# Altium footprint library 集大电协1.5.PcbLib: 227 footprints (part 4 of 18)
Each footprint in its own frame and in the unit in brackets; x right, y up, seen from the top. Pads: shape width x height; smd on the part's side, far side on the other; paste and mask are expansions set on the pad; w line width, h text height; cw(c..) or ccw(c..) is an arc to the next point about the centre after c.
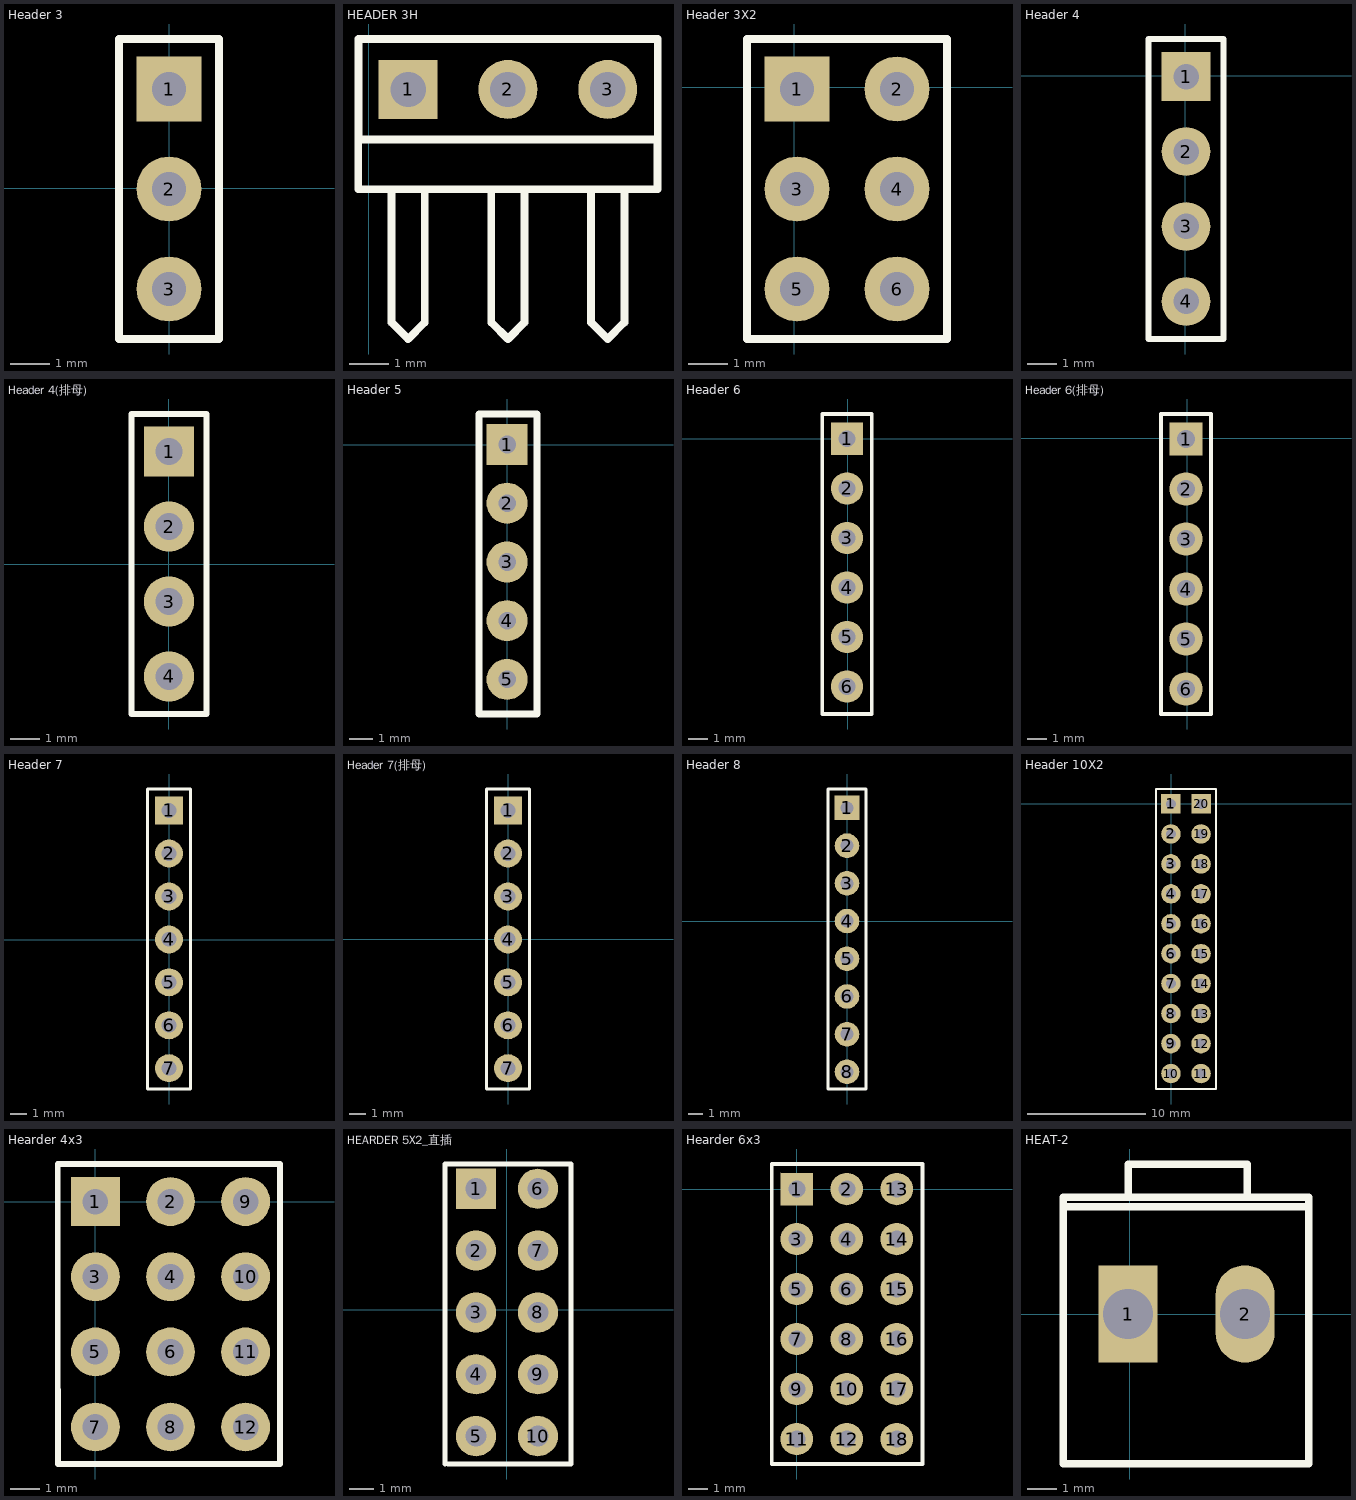
[diagram p3: the footprints below, top view; thin cyan lines are the x and y axes]

## Header 3 [mil]
pads (3):
  rect 65x65 hole 34: 1(0,99)
  round 65 hole 34: 2(0,-1) 3(0,-101)
Top Overlay:
  lines w7.87: -50,-151 50,-151 50,149 -50,149 -50,-151
3D body "HDR1X3_2.54mm.STEP": height 336.22, standoff -118.11, extent -50,-151 50,149

## HEADER 3H [mm]
pads (3):
  rect 1.5x1.5 hole 0.9: 1(1.007,-2.396)
  round 1.5 hole 0.9: 2(3.547,-2.396) 3(6.087,-2.396)
Top Overlay:
  lines w0.2: -0.258,-3.652 -0.258,-1.112 7.362,-1.112 7.362,-3.652 ; 0.584,-4.936 0.584,-8.323 1.007,-8.746 1.431,-8.323 1.431,-4.936 ; 3.124,-4.936 3.124,-8.323 3.547,-8.746 3.971,-8.323 3.971,-4.936 ; 5.664,-4.936 5.664,-8.323 6.087,-8.746 6.511,-8.323 6.511,-4.936 ; -0.263,-4.936 7.357,-4.936 7.357,-3.666 -0.263,-3.666 -0.263,-4.936
3D body "hdr3.stp": height 2.54, standoff -1, extent -0.263,-12.365 7.357,-2.015

## Header 3X2 [mil]
pads (6):
  rect 65x65 hole 34: 1(2.94,-1.52)
  round 65 hole 34: 2(102.94,-1.52) 3(2.94,-101.52) 4(102.94,-101.52) 5(2.94,-201.52) 6(102.94,-201.52)
Top Overlay:
  lines w7.87: -47.06,-59.86 -47.06,-251.52 ; -47.06,-251.52 152.94,-251.52 152.94,48.48 -47.06,48.48 -47.06,-251.52
3D body "61300621121.stp": height 338.19, standoff -116.14, extent -45.52,-254 154.48,46

## Header 4 [mil]
pads (4):
  rect 65x65 hole 34: 1(0.95,-0.93)
  round 65 hole 34: 2(0.95,-100.93) 3(0.95,-200.93) 4(0.95,-300.93)
Top Overlay:
  lines w7.87: -49.05,-350.93 50.95,-350.93 50.95,49.07 -49.05,49.07 -49.05,-350.93
3D body "HDR1X4_2.54mm.STEP": height 336.22, standoff -118.11, extent -51.18,-353.54 48.82,46.46

## Header 4(排母) [mm]
pads (4):
  rect 1.7x1.7 hole 0.9: 1(0.015,3.826)
  round 1.7 hole 0.9: 2(0.015,1.286) 3(0.015,-1.254) 4(0.015,-3.794)
Top Overlay:
  lines w0.2: -1.255,-5.064 -1.255,5.096 1.285,5.096 1.285,-5.064 -1.255,-5.064
3D body "HDR2.54-1P_M.STEP": height 8.5, standoff -3, extent -1.255,0.016 1.285,2.556
3D body "HDR2.54-1P_M.STEP": height 8.5, standoff -3, extent -1.255,2.556 1.285,5.096
3D body "HDR2.54-1P_M.STEP": height 8.5, standoff -3, extent -1.255,-5.064 1.285,-2.524
3D body "HDR2.54-1P_M.STEP": height 8.5, standoff -3, extent -1.255,-2.524 1.285,0.016

## Header 5 [mil]
pads (5):
  rect 70x70 hole 30: 1(0,0)
  round 70 hole 30: 2(0,-100) 3(0,-200) 4(0,-300) 5(0,-400)
Top Overlay:
  lines w12: -48,-459 -48,52 51,52 51,-459 -48,-459
3D body "User Library-CONMHS2A-2mm54.STEP": height 314.96, standoff -118.11, extent -46.81,-452 53.19,-252
3D body "HDR1X3_2.54mm.STEP": height 336.22, standoff -118.11, extent -50,-250 50,50

## Header 6 [mil]
pads (6):
  rect 65x65 hole 34: 1(-1.02,0.06)
  round 65 hole 34: 2(-1.02,-99.94) 3(-1.02,-199.94) 4(-1.02,-299.94) 5(-1.02,-399.75) 6(-1.02,-499.75)
Top Overlay:
  lines w7.87: -51.02,-555.12 48.98,-555.12 48.98,50.06 -51.02,50.06 -51.02,-555.12
3D body "HDR1X6_2.54mm.STEP": height 336.22, standoff -118.11, extent -50,-553.74 50,46.26

## Header 6(排母) [mm]
pads (6):
  rect 1.7x1.7 hole 0.9: 1(-0.06,-0.04)
  round 1.7 hole 0.9: 2(-0.06,-2.58) 3(-0.06,-5.12) 4(-0.06,-7.66) 5(-0.06,-10.2) 6(-0.06,-12.74)
Top Overlay:
  lines w0.2: -1.33,-14.01 -1.33,1.23 1.21,1.23 1.21,-14.01 -1.33,-14.01
3D body "HDR2.54-1P_M.STEP": height 8.5, standoff -3, extent -1.33,-11.47 1.21,-8.93
3D body "HDR2.54-1P_M.STEP": height 8.5, standoff -3, extent -1.33,-8.93 1.21,-6.39
3D body "HDR2.54-1P_M.STEP": height 8.5, standoff -3, extent -1.33,-14.01 1.21,-11.47
3D body "HDR2.54-1P_M.STEP": height 8.5, standoff -3, extent -1.33,-3.85 1.21,-1.31
3D body "HDR2.54-1P_M.STEP": height 8.5, standoff -3, extent -1.33,-1.31 1.21,1.23
3D body "HDR2.54-1P_M.STEP": height 8.5, standoff -3, extent -1.33,-6.39 1.21,-3.85

## Header 7 [mil]
pads (7):
  rect 65x65 hole 34: 1(0,301)
  round 65 hole 34: 2(0,201) 3(0,101) 4(0,1) 5(0,-98.8) 6(0,-198.8)
  round 65 hole 34 paste+0: 7(0,-298.61)
Top Overlay:
  lines w7.87: -50,-347 -50,351 50,351 50,-347 -49,-347
3D body: height 336.22, standoff -118.11, extent -50,-348.61 50,351.39

## Header 7(排母) [mil]
pads (7):
  rect 65x65 hole 34: 1(0,300)
  round 65 hole 34: 2(0,200) 3(0,100) 4(0,0) 5(0,-99.8) 6(0,-199.8)
  round 65 hole 34 paste+0: 7(0,-299.61)
Top Overlay:
  lines w7.87: -50,-348 -50,350 50,350 50,-348 -49,-348
3D body "HDR2.54-1P_M.STEP": height 334.65, standoff -118.11, extent -50,250 50,350
3D body "HDR2.54-1P_M.STEP": height 334.65, standoff -118.11, extent -50,150 50,250
3D body "HDR2.54-1P_M.STEP": height 334.65, standoff -118.11, extent -50,50 50,150
3D body "HDR2.54-1P_M.STEP": height 334.65, standoff -118.11, extent -50,-50 50,50
3D body "HDR2.54-1P_M.STEP": height 334.65, standoff -118.11, extent -50,-149.8 50,-49.8
3D body "HDR2.54-1P_M.STEP": height 334.65, standoff -118.11, extent -50,-249.8 50,-149.8
3D body "HDR2.54-1P_M.STEP": height 334.65, standoff -118.11, extent -50,-349.61 50,-249.61

## Header 8 [mil]
pads (8):
  rect 65x65 hole 34: 1(0,300)
  round 65 hole 34: 2(0,200) 3(0,100) 4(0,0) 5(0,-99.8) 6(0,-199.8) 8(0,-399.61)
  round 65 hole 34 paste+0: 7(0,-299.61)
Top Overlay:
  lines w7.87: -50,-445 50,-445 50,350 -50,350 -50,-445
3D body "HDR1X8_2.54mm.STEP": height 336.22, standoff -118.11, extent -49,-451 51,349

## Header 10X2 [mil]
pads (20):
  rect 65x65 hole 34: 1(-0.98,-0.2) 20(99.41,-0.2)
  round 65 hole 34: 2(-0.98,-100.2) 3(-0.98,-200.2) 4(-0.98,-300.2) 5(-0.98,-400) 6(-0.98,-500) 8(-0.98,-699.8) 10(-0.98,-900.2) 11(99.41,-900.2) 13(99.41,-699.8) 15(99.41,-500) 16(99.41,-400) 17(99.41,-300.2) 18(99.41,-200.2) 19(99.41,-100.2)
  round 65 hole 34 paste+0: 7(-0.98,-599.8) 9(-0.98,-800.2) 12(99.41,-800.2) 14(99.41,-599.8)
Top Overlay:
  lines w7.87: 49.02,-951.77 -50.98,-951.77 -50.98,49.8 49.02,49.8 ; 49.41,-951.77 149.41,-951.77 149.41,49.8 49.41,49.8
3D body "HDR-1x2_H.STEP": height 200.79, standoff -118.11, extent -13.19,-547.83 492.72,-447.83
3D body "HDR-1x2_H.STEP": height 200.79, standoff -118.11, extent -13.19,-747.83 492.72,-647.83
3D body "HDR-1x2_H.STEP": height 200.79, standoff -118.11, extent -13.19,-647.83 492.72,-547.83
3D body "HDR-1x2_H.STEP": height 200.79, standoff -118.11, extent -13.19,-947.83 492.72,-847.83
3D body "HDR-1x2_H.STEP": height 200.79, standoff -118.11, extent -13.19,-847.83 492.72,-747.83
3D body "HDR-1x2_H.STEP": height 200.79, standoff -118.11, extent -13.19,-47.83 492.72,52.17
3D body "HDR-1x2_H.STEP": height 200.79, standoff -118.11, extent -13.19,-247.83 492.72,-147.83
3D body "HDR-1x2_H.STEP": height 200.79, standoff -118.11, extent -13.19,-147.83 492.72,-47.83
3D body "HDR-1x2_H.STEP": height 200.79, standoff -118.11, extent -13.19,-447.83 492.72,-347.83
3D body "HDR-1x2_H.STEP": height 200.79, standoff -118.11, extent -13.19,-347.83 492.72,-247.83

## Hearder 4x3 [mil]
pads (12):
  rect 65x65 hole 34: 1(0,0)
  round 65 hole 34: 2(100,0) 3(0,-100) 4(100,-100) 5(0,-200) 6(100,-200) 7(0,-300) 8(100,-300) 9(200,0) 10(200,-100) 11(200,-200) 12(200,-300)
Top Overlay:
  lines w7.87: -50,-58.33 -50,-250 -50,50 150,50
  lines w8: -50,-250 -50,-349.21 146.85,-349.21 246,-349.21 246,50 150,50
3D body "HDR1X4_2.54mm.STEP": height 336.22, standoff -118.11, extent 147.87,-352.61 247.87,47.39
3D body "HDR1X4_2.54mm.STEP": height 336.22, standoff -118.11, extent 47.87,-352.61 147.87,47.39
3D body "HDR1X4_2.54mm.STEP": height 336.22, standoff -118.11, extent -52.13,-352.61 47.87,47.39

## HEARDER 5X2_直插 [mil]
pads (10):
  rect 65x65 hole 34: 1(-50,196)
  round 65 hole 34: 2(-50,96) 3(-50,-4) 4(-50,-104) 5(-50,-204) 6(50,196) 7(50,96) 8(50,-4) 9(50,-104) 10(50,-204)
Top Overlay:
  lines w7.87: -100,-249 -100,236 103.43,236 103.43,-249 -95.43,-249
3D body "User Library-Hirose - DF11-10DP-2DSA(24) (Shrouded Header 2mm, 10 Pin).STEP": height 259.84, standoff -118.11, extent -94.43,-242 102.43,230.44

## Hearder 6x3 [mil]
pads (18):
  rect 65x65 hole 34: 1(0,0)
  round 65 hole 34: 2(100,0) 3(0,-100) 4(100,-100) 5(0,-200) 6(100,-200) 7(0,-300) 8(100,-300) 9(0,-400) 10(100,-400) 11(0,-500) 12(100,-500) 13(200,0) 14(200,-100) 15(200,-200) 16(200,-300) 17(200,-400) 18(200,-500)
Top Overlay:
  lines w7.87: -50,-358.33 -50,-550 ; -50,-58.33 -50,-250 ; 251,-550 -50,-550 ; 251,50 -50,50 -50,-250 ; -50,-550 -50,-250
  lines w8: 251,-550 251,50
3D body "61300621121.stp": height 338.19, standoff -116.14, extent -48.46,-552.48 151.54,-252.48
3D body "61300621121.stp": height 338.19, standoff -116.14, extent -48.46,-252.48 151.54,47.52
3D body "HDR1X6_2.54mm.STEP": height 336.22, standoff -118.11, extent 151.02,-553.8 251.02,46.2

## HEAT-2 [mm]
pads (2):
  rect 2x3.3 hole 1.7: 1(-0.051,0.007)
  oval 2x3.3 hole 1.7: 2(3.909,0.007)
Top Overlay:
  lines w0.254: -2.251,3.639 6.069,3.639 ; -0.051,3.967 -0.051,5.087 3.988,5.087 3.988,3.967 ; -2.251,-5.073 -2.251,3.967 6.069,3.967 6.069,-5.073 -2.251,-5.073
3D body "molex-22-27-2021.STEP": height 11.68, standoff -3.56, extent -0.47,-3.57 4.61,2.78